# Altium footprint library S7CAS_LIB2023.PcbLib: 116 footprints (part 5 of 8)
Each footprint in its own frame and in the unit in brackets; x right, y up, seen from the top. Pads: shape width x height; smd on the part's side, far side on the other; paste and mask are expansions set on the pad; w line width, h text height; cw(c..) or ccw(c..) is an arc to the next point about the centre after c.
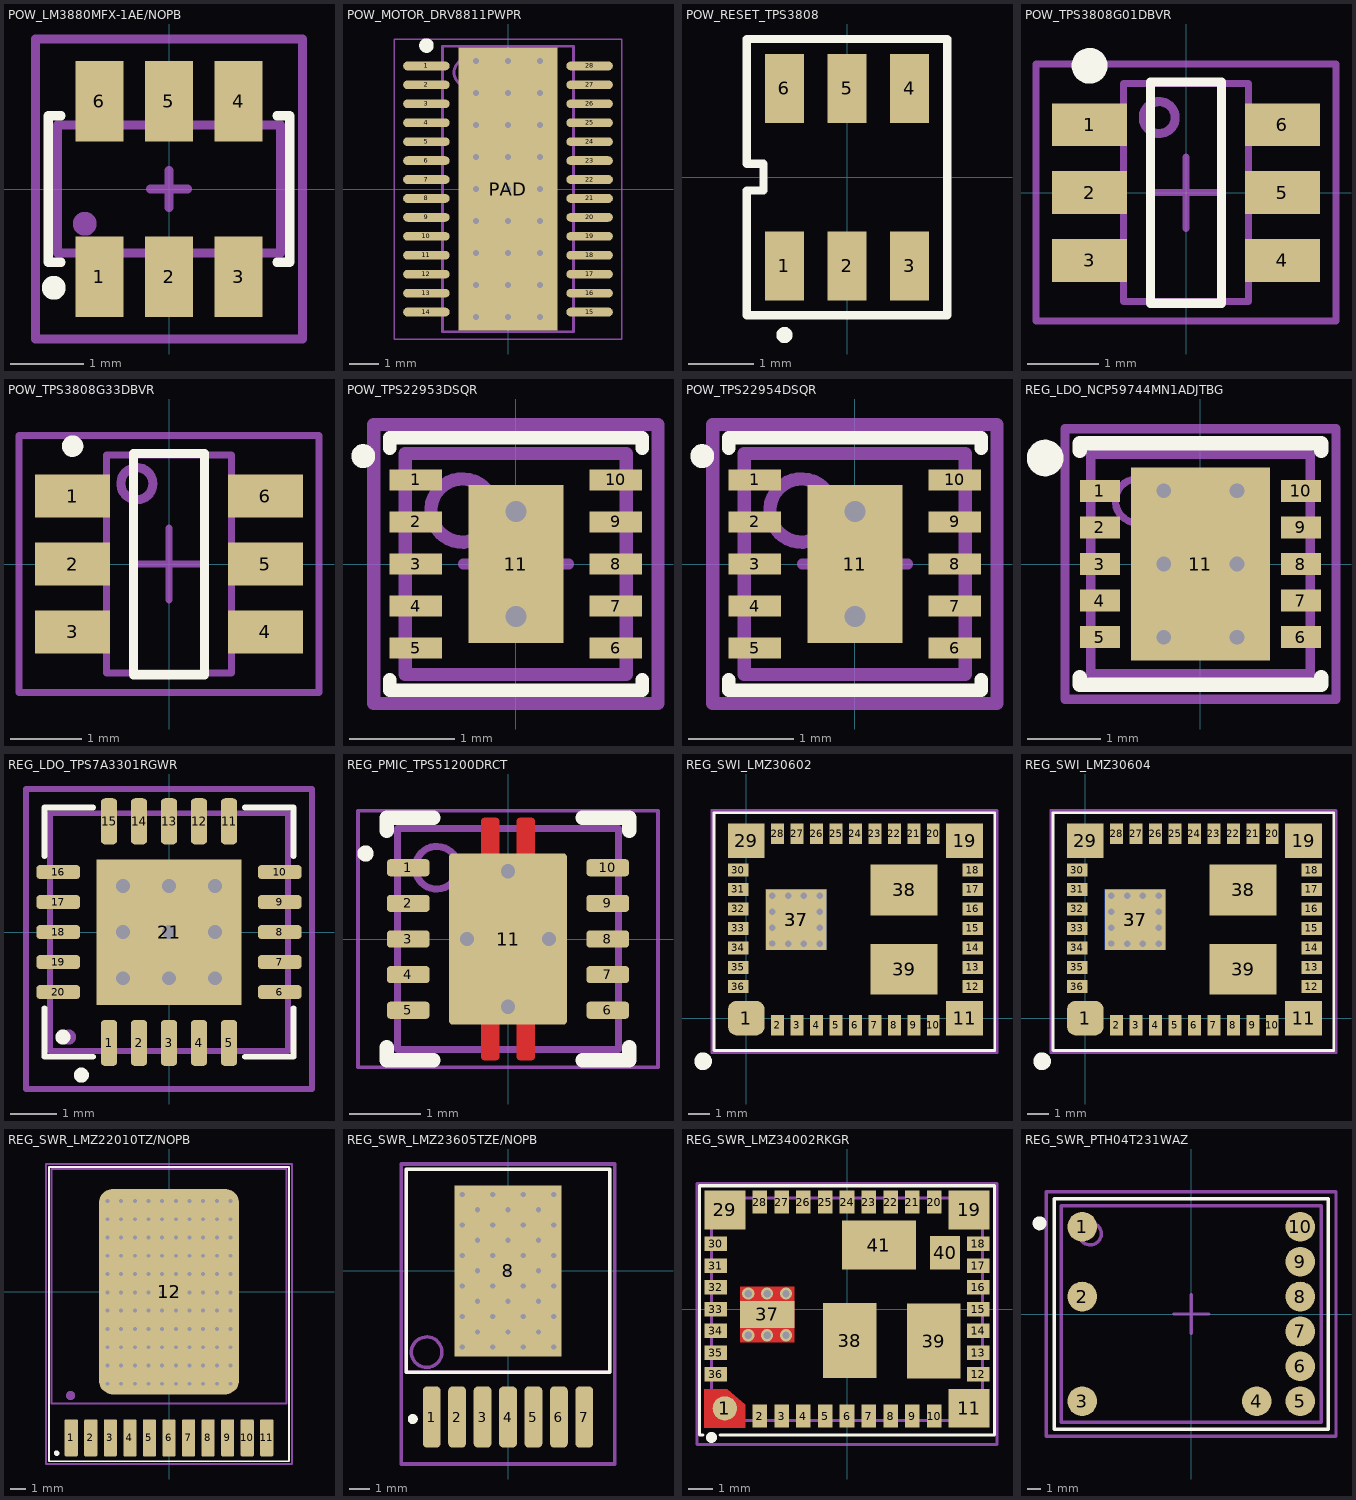
[diagram p4: the footprints below, top view; thin cyan lines are the x and y axes]

## POW_LM3880MFX-1AE/NOPB [mm]
pads (6):
  rect 0.65x1.1 smd paste-0.025 mask+0.07: 1(-0.95,-1.2) 2(0,-1.2) 3(0.95,-1.2) 4(0.95,1.2) 5(0,1.2) 6(-0.95,1.2)
Top Overlay:
  circle w0.254: c-1.575,-1.35 r0.035
  lines w0.127: -1.475,-1 -1.65,-1 -1.65,1 -1.475,1 ; 1.475,-1 1.65,-1 1.65,1 1.475,1
Top Assembly:
  circle w0.254: c-1.15,-0.475 r0.035
  lines w0.127: -1.525,-0.875 -1.525,0.875 1.525,0.875 1.525,-0.875 -1.525,-0.875
Mechanical 15:
  lines w0.127: -0.254,0 0.254,0 ; 0,-0.254 0,0.254 ; -1.825,-2.05 -1.825,2.05 1.825,2.05 1.825,-2.05 -1.825,-2.05
3D body "User Library-SOT-23-6.step": height 1.09, standoff 0, extent -1.394,-1.254 1.4,1.172

## POW_MOTOR_DRV8811PWPR [mm] "TSOP, 28-Leads, Body 9,70x4,40mm, Pitch 0,65mm, Thermal Pad 9,70x3,40mm, IPC Medium Density"
height 1.2
pads (29):
  oval 1.6x0.3 smd: 1(-2.8,4.225) 2(-2.8,3.575) 3(-2.8,2.925) 4(-2.8,2.275) 5(-2.8,1.625) 6(-2.8,0.975) 7(-2.8,0.325) 8(-2.8,-0.325) 9(-2.8,-0.975) 10(-2.8,-1.625) 11(-2.8,-2.275) 12(-2.8,-2.925) 13(-2.8,-3.575) 14(-2.8,-4.225) 15(2.8,-4.225) 16(2.8,-3.575) 17(2.8,-2.925) 18(2.8,-2.275) 19(2.8,-1.625) 20(2.8,-0.975) 21(2.8,-0.325) 22(2.8,0.325) 23(2.8,0.975) 24(2.8,1.625) 25(2.8,2.275) 26(2.8,2.925) 27(2.8,3.575) 28(2.8,4.225)
  rect 3.4x9.7 smd paste-15 mask-15: PAD(0,0)
via -1.1,4.4 diameter 0.5 hole 0.2
via 0,4.4 diameter 0.5 hole 0.2
via 1.1,4.4 diameter 0.5 hole 0.2
via -1.1,3.3 diameter 0.5 hole 0.2
via 0,3.3 diameter 0.5 hole 0.2
via 1.1,3.3 diameter 0.5 hole 0.2
via -1.1,2.2 diameter 0.5 hole 0.2
via 0,2.2 diameter 0.5 hole 0.2
via 1.1,2.2 diameter 0.5 hole 0.2
via -1.1,1.1 diameter 0.5 hole 0.2
via 0,1.1 diameter 0.5 hole 0.2
via 1.1,1.1 diameter 0.5 hole 0.2
via -1.1,0 diameter 0.5 hole 0.2
via 0,0 diameter 0.5 hole 0.2
via 1.1,0 diameter 0.5 hole 0.2
via -1.1,-1.1 diameter 0.5 hole 0.2
via 0,-1.1 diameter 0.5 hole 0.2
via 1.1,-1.1 diameter 0.5 hole 0.2
via -1.1,-2.2 diameter 0.5 hole 0.2
via 0,-2.2 diameter 0.5 hole 0.2
via 1.1,-2.2 diameter 0.5 hole 0.2
via -1.1,-3.3 diameter 0.5 hole 0.2
via 0,-3.3 diameter 0.5 hole 0.2
via 1.1,-3.3 diameter 0.5 hole 0.2
via -1.1,-4.4 diameter 0.5 hole 0.2
via 0,-4.4 diameter 0.5 hole 0.2
via 1.1,-4.4 diameter 0.5 hole 0.2
Top Overlay:
  circle w0.25: c-2.8,4.925 r0.125
Top Paste:
  rectangle: -1.55,-2.58 1.55,2.58
Top Solder:
  rectangle: -1.55,-2.58 1.55,2.58
Mechanical 13:
  circle w0.1: c-1.35,4 r0.5
  lines w0.1: -2.25,-4.9 -2.25,4.9 2.25,4.9 2.25,-4.9 -2.25,-4.9
Mechanical 15:
  lines w0.05: -3.9,-5.15 -3.9,5.15 3.9,5.15 3.9,-5.15 -3.9,-5.15
  lines w0.1: -0.5,0 0.5,0 ; 0,-0.5 0,0.5
3D body "PMIC_MOTOR_DRV8811PWPR.step": height 1.2, standoff 0, extent -3.2,-4.9 3.2,4.9

## POW_RESET_TPS3808 [mm]
pads (6):
  rect 0.6x1.05 smd paste-0.025 mask+0.07: 1(-0.95,-1.35) 2(0,-1.35) 3(0.95,-1.35) 4(0.95,1.35) 5(0,1.35) 6(-0.95,1.35)
Top Overlay:
  circle w0.127: c-0.95,-2.4 r0.06
  lines w0.127: -1.525,-2.1 1.525,-2.1 1.525,2.1 -1.525,2.1 -1.525,0.203 -1.269,0.203 -1.269,-0.203 -1.525,-0.203 -1.525,-2.1
3D body "SOT23-6.step": height 1.3, standoff 0, extent -1.5,-1.5 1.5,1.5

## POW_TPS3808G01DBVR [mm]
pads (6):
  rect 1.05x0.6 smd paste-0.025 mask+0.07: 1(-1.35,0.95) 2(-1.35,0) 3(-1.35,-0.95) 4(1.35,-0.95) 5(1.35,0) 6(1.35,0.95)
Top Overlay:
  circle w0.25: c-1.35,1.775 r0.125
  lines w0.127: -0.5,-1.55 0.5,-1.55 0.5,1.55 -0.5,1.55 -0.5,-1.55
Top Assembly:
  circle w0.127: c-0.375,1.05 r0.224
  lines w0.1: -0.875,-1.525 -0.875,1.525 0.875,1.525 0.875,-1.525 -0.875,-1.525
Mechanical 15:
  lines w0.1: -0.5,0 0.5,0 ; 0,-0.5 0,0.5 ; -2.1,-1.8 -2.1,1.8 2.1,1.8 2.1,-1.8 -2.1,-1.8
3D body "SOT23127P600-8N.step": height 1.45, standoff 0, extent -1.5,-1.525 1.5,1.525

## POW_TPS3808G33DBVR [mm]
pads (6):
  rect 1.05x0.6 smd paste-0.025 mask+0.07: 1(-1.35,0.95) 2(-1.35,0) 3(-1.35,-0.95) 4(1.35,-0.95) 5(1.35,0) 6(1.35,0.95)
Top Overlay:
  circle w0.15: c-1.35,1.65 r0.075
  lines w0.127: -0.5,-1.55 0.5,-1.55 0.5,1.55 -0.5,1.55 -0.5,-1.55
Top Assembly:
  circle w0.127: c-0.45,1.125 r0.225
  lines w0.1: -0.875,-1.525 -0.875,1.525 0.875,1.525 0.875,-1.525 -0.875,-1.525
Mechanical 15:
  lines w0.1: -0.5,0 0.5,0 ; 0,-0.5 0,0.5 ; -2.1,-1.8 -2.1,1.8 2.1,1.8 2.1,-1.8 -2.1,-1.8
3D body "SOT23127P600-8N.step": height 1.45, standoff 0, extent -1.5,-1.525 1.5,1.525

## POW_TPS22953DSQR [mm]
pads (11):
  rect 0.5x0.2 smd paste+0 mask+0.06: 1(-0.95,0.8) 2(-0.95,0.4) 3(-0.95,0) 4(-0.95,-0.4) 5(-0.95,-0.8) 6(0.95,-0.8) 7(0.95,-0.4) 8(0.95,0) 9(0.95,0.4) 10(0.95,0.8)
  rect 0.9x1.5 smd paste-5 mask+0.07: 11(0,0)
via 0,-0.5 diameter 0.4 hole 0.2
via 0,0.5 diameter 0.4 hole 0.2
Top Overlay:
  circle w0.127: c-1.45,1.025 r0.05
  lines w0.127: -1.2,-1.1 -1.2,-1.2 1.2,-1.2 1.2,-1.1 ; -1.2,1.1 -1.2,1.2 1.2,1.2 1.2,1.1
Top Paste:
  rectangle: -0.425,-0.69 0.425,0.69
Top Assembly:
  circle w0.127: c-0.508,0.508 r0.3
  lines w0.127: -1.05,-1.05 1.05,-1.05 1.05,1.05 -1.05,1.05 -1.05,-1.05
Mechanical 15:
  lines w0.1: -0.5,0 0.5,0 ; 0,-0.5 0,0.5
  lines w0.127: -1.35,-1.325 1.35,-1.325 1.35,1.325 -1.35,1.325 -1.35,-1.325
3D body "PSON40P200X80_HS-11N.step": height 0.8, standoff 0, extent -1.051,-1.05 1.051,1.05

## POW_TPS22954DSQR [mm]
pads (11):
  rect 0.5x0.2 smd paste+0 mask+0.06: 1(-0.95,0.8) 2(-0.95,0.4) 3(-0.95,0) 4(-0.95,-0.4) 5(-0.95,-0.8) 6(0.95,-0.8) 7(0.95,-0.4) 8(0.95,0) 9(0.95,0.4) 10(0.95,0.8)
  rect 0.9x1.5 smd paste-5 mask+0.07: 11(0,0)
via 0,0.5 diameter 0.4 hole 0.2
via 0,-0.5 diameter 0.4 hole 0.2
Top Overlay:
  circle w0.127: c-1.45,1.025 r0.05
  lines w0.127: -1.2,-1.1 -1.2,-1.2 1.2,-1.2 1.2,-1.1 ; -1.2,1.1 -1.2,1.2 1.2,1.2 1.2,1.1
Top Paste:
  rectangle: -0.425,-0.69 0.425,0.69
Top Assembly:
  circle w0.127: c-0.508,0.508 r0.3
  lines w0.127: -1.05,-1.05 -1.05,1.05 1.05,1.05 1.05,-1.05 -1.05,-1.05
Mechanical 15:
  lines w0.1: -0.5,0 0.5,0 ; 0,-0.5 0,0.5
  lines w0.127: -1.35,-1.325 -1.35,1.325 1.35,1.325 1.35,-1.325 -1.35,-1.325
3D body "PSON40P200X80_HS-11N.step": height 0.8, standoff 0, extent -1.051,-1.05 1.051,1.05

## REG_LDO_NCP59744MN1ADJTBG [mm]
pads (11):
  rect 0.55x0.3 smd paste-0.025 mask+0.04: 1(-1.375,1) 2(-1.375,0.5) 3(-1.375,0) 4(-1.375,-0.5) 5(-1.375,-1) 6(1.375,-1) 7(1.375,-0.5) 8(1.375,0) 9(1.375,0.5) 10(1.375,1)
  rect 1.9x2.64 smd paste-2.64 mask+0.03: 11(0,0)
via -0.5,0 diameter 0.4 hole 0.2
via 0.5,0 diameter 0.4 hole 0.2
via -0.5,1 diameter 0.4 hole 0.2
via -0.5,-1 diameter 0.4 hole 0.2
via 0.5,1 diameter 0.4 hole 0.2
via 0.5,-1 diameter 0.4 hole 0.2
Top Overlay:
  circle w0.25: c-2.125,1.45 r0.125
  lines w0.2: -1.65,-1.55 -1.65,-1.65 1.625,-1.65 ; -1.65,1.55 -1.65,1.65 ; -1.625,1.65 1.65,1.65 1.65,1.55 ; 1.65,-1.65 1.65,-1.55
Top Paste:
  rectangle: -0.9,-1.25 0.9,-0.1
  rectangle: -0.9,0.1 0.9,1.25
Top Assembly:
  circle w0.1: c-0.864,0.864 r0.3
  lines w0.1: -1.5,-1.5 1.5,-1.5 1.5,1.5 -1.5,1.5 -1.5,-1.5
  lines w0.127: -1.5,-1.5 -1.5,1.5 1.5,1.5 1.5,-1.5 -1.5,-1.5
Mechanical 15:
  lines w0.1: -0.5,0 0.5,0 ; 0,-0.5 0,0.5
  lines w0.127: -1.854,-1.85 -1.854,1.85 1.854,1.85 1.854,-1.85 -1.854,-1.85
3D body "QFN127P600-8N_2.step": height 1, standoff 0, extent -1.501,-1.5 1.501,1.5

## REG_LDO_TPS7A3301RGWR [mm]
pads (21):
  rrect50% 0.35x1 smd paste-0.025 mask+0.07: 1(-1.3,-2.4) 2(-0.65,-2.4) 3(0,-2.4) 4(0.65,-2.4) 5(1.3,-2.4) 11(1.3,2.4) 12(0.65,2.4) 13(0,2.4) 14(-0.65,2.4) 15(-1.3,2.4)
  rrect50% 0.95x0.3 smd paste-0.025 mask+0.07: 6(2.4,-1.3) 7(2.4,-0.65) 8(2.4,0) 9(2.4,0.65) 10(2.4,1.3) 16(-2.4,1.3) 17(-2.4,0.65) 18(-2.4,0) 19(-2.4,-0.65) 20(-2.4,-1.3)
  rect 3.15x3.15 smd paste-3.15 mask+0: 21(0,0)
via 1,-1 diameter 0.5 hole 0.3
via 0,-1 diameter 0.5 hole 0.3
via 0,1 diameter 0.5 hole 0.3
via -1,1 diameter 0.5 hole 0.3
via -1,-1 diameter 0.5 hole 0.3
via -1,0 diameter 0.5 hole 0.3
via 0,0 diameter 0.5 hole 0.3
via 1,1 diameter 0.5 hole 0.3
via 1,0 diameter 0.5 hole 0.3
Top Overlay:
  circle w0.254: c-2.3,-2.275 r0.035
  circle w0.254: c-1.9,-3.1 r0.035
  lines w0.127: -2.7,-1.65 -2.7,-2.7 -1.65,-2.7 ; -2.7,1.65 -2.7,2.7 -1.65,2.7 ; 1.65,-2.7 2.7,-2.7 2.7,-1.65 ; 1.65,2.7 2.7,2.7 2.7,1.65
Top Paste:
  rectangle: -1.5,0.2 -0.2,1.5
  rectangle: -1.5,-1.5 -0.2,-0.2
  rectangle: 0.2,-1.5 1.5,-0.2
  rectangle: 0.2,0.2 1.5,1.5
  region: -0.55,-1.05
Top Assembly:
  circle w0.254: c-2.175,-2.275 r0.035
  lines w0.127: -2.575,-2.575 2.575,-2.575 2.575,2.575 -2.575,2.575 -2.575,-2.575
Mechanical 15:
  lines w0.127: -0.5,0 0.5,0 ; 0,-0.5 0,0.5 ; -3.1,-3.4 -3.1,3.1 3.1,3.1 3.1,-3.4 -3.1,-3.4
3D body "User Library-QFN-20 5x5x0_9mm.step": height 0.88, standoff -0.02, extent -2.51,-2.51 2.51,2.51

## REG_PMIC_TPS51200DRCT [mm]
pads (11):
  rrect41% 0.6x0.24 smd mask+0.07: 1(-1.4,1) 2(-1.4,0.5) 3(-1.4,0) 4(-1.4,-0.5) 5(-1.4,-1) 6(1.4,-1) 7(1.4,-0.5) 8(1.4,0) 9(1.4,0.5) 10(1.4,1)
  rrect5% 1.65x2.4 smd paste-5 mask+0.07: 11(0,0)
via 0,-0.95 diameter 0.5 hole 0.2
via 0.575,0 diameter 0.5 hole 0.2
via -0.575,0 diameter 0.5 hole 0.2
via 0,0.95 diameter 0.5 hole 0.2
Top Layer:
  region: -0.325,-1.7 -0.335,-1.7 -0.353,-1.692 -0.367,-1.678 -0.375,-1.66 -0.375,-1.65 -0.375,1.65 -0.375,1.66 -0.367,1.678 -0.353,1.692 -0.335,1.7 -0.325,1.7 -0.175,1.7 -0.165,1.7 -0.147,1.692 -0.133,1.678 -0.125,1.66 -0.125,1.65 -0.125,-1.65 -0.125,-1.66 -0.133,-1.678 -0.147,-1.692 -0.165,-1.7 -0.175,-1.7
  region: 0.175,-1.7 0.165,-1.7 0.147,-1.692 0.133,-1.678 0.125,-1.66 0.125,-1.65 0.125,1.65 0.125,1.66 0.133,1.678 0.147,1.692 0.165,1.7 0.175,1.7 0.325,1.7 0.335,1.7 0.353,1.692 0.367,1.678 0.375,1.66 0.375,1.65 0.375,-1.65 0.375,-1.66 0.367,-1.678 0.353,-1.692 0.335,-1.7 0.325,-1.7
Top Overlay:
  circle w0.127: c-2,1.2 r0.05
  lines w0.2: -1.7,-1.52 -1.7,-1.7 -1.045,-1.7 ; -1.7,1.52 -1.7,1.7 -1.045,1.7 ; 1.045,-1.7 1.7,-1.7 1.7,-1.52 ; 1.045,1.7 1.7,1.7 1.7,1.52
Top Paste:
  drawing of 7 lines, arcs and shapes, not listed
Top Assembly:
  circle w0.1: c-1,1 r0.3
  lines w0.1: -1.55,-1.55 -1.55,1.55 1.55,1.55 1.55,-1.55 -1.55,-1.55
Mechanical 15:
  lines w0.05: -2.105,-1.8 -2.105,1.8 2.105,1.8 2.105,-1.8 -2.105,-1.8
  lines w0.1: -0.5,0 0.5,0 ; 0,-0.5 0,0.5
3D body "REG_PMIC_TPS51200DRCT.step": height 1, standoff 0, extent -1.551,-1.55 1.551,1.55

## REG_SWI_LMZ30602 [mm] "Non-Isolated PoL Module DC DC Converter 1 Output 0.8 ~ 3.6V 2A 2.95V - 6V Input"
pads (40):
  rrect50% 1.7x1.6 smd mask+0.07: 1(0,0)
  rect 0.6x0.95 smd mask+0.07: 2(1.45,-0.325) 3(2.35,-0.325) 4(3.25,-0.325) 5(4.15,-0.325) 6(5.05,-0.325) 7(5.95,-0.325) 8(6.85,-0.325) 9(7.75,-0.325) 10(8.65,-0.325) 20(8.65,8.525) 21(7.75,8.525) 22(6.85,8.525) 23(5.95,8.525) 24(5.05,8.525) 25(4.15,8.525) 26(3.25,8.525) 27(2.35,8.525) 28(1.45,8.525)
  rect 1.7x1.6 smd mask+0.07: 11(10.1,0) 19(10.1,8.2) 29(0,8.2)
  rect 0.95x0.6 smd mask+0.07: 12(10.475,1.45) 13(10.475,2.35) 14(10.475,3.25) 15(10.475,4.15) 16(10.475,5.05) 17(10.475,5.95) 18(10.475,6.85) 30(-0.375,6.85) 31(-0.375,5.95) 32(-0.375,5.05) 33(-0.375,4.15) 34(-0.375,3.25) 35(-0.375,2.35) 36(-0.375,1.45)
  rect 2.8x2.8 smd mask+0.07: 37(2.3,4.55)
  rect 2.8x2.8 smd far side mask+0.07: 37(2.3,4.55)
  rect 3.1x2.35 smd mask+0.07: 38(7.3,5.93) 39(7.3,2.26)
via 2.667,5.65 diameter 0.5 hole 0.3
via 1.937,5.65 diameter 0.5 hole 0.3
via 1.2,5.65 diameter 0.5 hole 0.3
via 1.2,4.915 diameter 0.5 hole 0.3
via 1.2,3.45 diameter 0.5 hole 0.3
via 1.2,4.185 diameter 0.5 hole 0.3
via 3.402,3.45 diameter 0.5 hole 0.3
via 2.667,3.45 diameter 0.5 hole 0.3
via 1.937,3.45 diameter 0.5 hole 0.3
via 3.402,5.65 diameter 0.5 hole 0.3
via 3.402,4.915 diameter 0.5 hole 0.3
via 3.402,4.185 diameter 0.5 hole 0.3
Top Overlay:
  circle w0.254: c-2,-2 r0.02
  circle w0.254: c-2,-2 r0.145
  circle w0.254: c-2,-2 r0.283
  lines w0.127: -1.5,-1.5 -1.5,9.5 11.5,9.5 11.5,-1.5 -1.5,-1.5
  text ".Designator" at 0.754,10.008 h0.76
Top Designator:
  text ".Designator" at 1.454,3.958 h0.76
Mechanical 15:
  lines w0.127: -1.6,-1.6 -1.6,9.6 11.6,9.6 11.6,-1.6 -1.6,-1.6
3D body "RKG0039A.stp": height 2.9, standoff 0, extent -0.4,-0.4 10.6,8.6

## REG_SWI_LMZ30604 [mm] "Non-Isolated PoL Module DC DC Converter 1 Output 0.8 ~ 3.6V 4A 2.95V - 6V Input"
pads (40):
  rrect50% 1.7x1.6 smd mask+0.07: 1(0,0)
  rect 0.6x0.95 smd mask+0.07: 2(1.45,-0.325) 3(2.35,-0.325) 4(3.25,-0.325) 5(4.15,-0.325) 6(5.05,-0.325) 7(5.95,-0.325) 8(6.85,-0.325) 9(7.75,-0.325) 10(8.65,-0.325) 20(8.65,8.525) 21(7.75,8.525) 22(6.85,8.525) 23(5.95,8.525) 24(5.05,8.525) 25(4.15,8.525) 26(3.25,8.525) 27(2.35,8.525) 28(1.45,8.525)
  rect 1.7x1.6 smd mask+0.07: 11(10.1,0) 19(10.1,8.2) 29(0,8.2)
  rect 0.95x0.6 smd mask+0.07: 12(10.475,1.45) 13(10.475,2.35) 14(10.475,3.25) 15(10.475,4.15) 16(10.475,5.05) 17(10.475,5.95) 18(10.475,6.85) 30(-0.375,6.85) 31(-0.375,5.95) 32(-0.375,5.05) 33(-0.375,4.15) 34(-0.375,3.25) 35(-0.375,2.35) 36(-0.375,1.45)
  rect 2.8x2.8 smd mask+0.07: 37(2.3,4.55)
  rect 2.8x2.8 smd far side mask+0.07: 37(2.3,4.55)
  rect 3.1x2.35 smd mask+0.07: 38(7.3,5.93) 39(7.3,2.26)
via 2.667,5.65 diameter 0.5 hole 0.3
via 1.937,5.65 diameter 0.5 hole 0.3
via 1.2,5.65 diameter 0.5 hole 0.3
via 1.2,4.915 diameter 0.5 hole 0.3
via 1.2,3.45 diameter 0.5 hole 0.3
via 1.2,4.185 diameter 0.5 hole 0.3
via 3.402,3.45 diameter 0.5 hole 0.3
via 2.667,3.45 diameter 0.5 hole 0.3
via 1.937,3.45 diameter 0.5 hole 0.3
via 3.402,5.65 diameter 0.5 hole 0.3
via 3.402,4.915 diameter 0.5 hole 0.3
via 3.402,4.185 diameter 0.5 hole 0.3
Top Overlay:
  circle w0.254: c-2,-2 r0.02
  circle w0.254: c-2,-2 r0.145
  circle w0.254: c-2,-2 r0.283
  lines w0.127: -1.5,-1.5 11.5,-1.5 11.5,9.5 -1.5,9.5 -1.5,-1.5
  text ".Designator" at 0.754,10.008 h0.76
Top Designator:
  text ".Designator" at 1.454,3.958 h0.76
Mechanical 15:
  lines w0.127: -1.6,-1.6 11.6,-1.6 11.6,9.6 -1.6,9.6 -1.6,-1.6
3D body "RKG0039A.stp": height 2.9, standoff 0, extent -0.4,-0.4 10.6,8.6

## REG_SWR_LMZ22010TZ/NOPB [mm]
pads (12):
  rrect20% 0.86x2.41 smd paste-0.025 mask+0.07: 1(-6.35,-9.5) 2(-5.08,-9.5) 3(-3.81,-9.5) 4(-2.54,-9.5) 5(-1.27,-9.5) 6(0,-9.5) 7(1.27,-9.5) 8(2.54,-9.5) 9(3.81,-9.5) 10(5.08,-9.5) 11(6.35,-9.5)
  rrect20% 9.126x13.37 smd paste-13.37 mask+0.05: 12(0,0)
via 4,-5.987 diameter 0.457 hole 0.254
via 3.111,-5.987 diameter 0.457 hole 0.254
via 2.222,-5.987 diameter 0.457 hole 0.254
via 1.333,-5.987 diameter 0.457 hole 0.254
via 0.445,-5.987 diameter 0.457 hole 0.254
via -0.445,-5.987 diameter 0.457 hole 0.254
via -1.333,-5.987 diameter 0.457 hole 0.254
via -2.222,-5.987 diameter 0.457 hole 0.254
via -3.111,-5.987 diameter 0.457 hole 0.254
via -4,-5.987 diameter 0.457 hole 0.254
via 4,-4.798 diameter 0.457 hole 0.254
via 3.111,-4.798 diameter 0.457 hole 0.254
via 2.222,-4.798 diameter 0.457 hole 0.254
via 1.333,-4.798 diameter 0.457 hole 0.254
via 0.445,-4.798 diameter 0.457 hole 0.254
via -0.445,-4.798 diameter 0.457 hole 0.254
via -1.333,-4.798 diameter 0.457 hole 0.254
via -2.222,-4.798 diameter 0.457 hole 0.254
via -3.111,-4.798 diameter 0.457 hole 0.254
via -4,-4.798 diameter 0.457 hole 0.254
via 4,-3.61 diameter 0.457 hole 0.254
via 3.111,-3.61 diameter 0.457 hole 0.254
via 2.222,-3.61 diameter 0.457 hole 0.254
via 1.333,-3.61 diameter 0.457 hole 0.254
via 0.445,-3.61 diameter 0.457 hole 0.254
via -0.445,-3.61 diameter 0.457 hole 0.254
via -1.333,-3.61 diameter 0.457 hole 0.254
via -2.222,-3.61 diameter 0.457 hole 0.254
via -3.111,-3.61 diameter 0.457 hole 0.254
via -4,-3.61 diameter 0.457 hole 0.254
via 4,-2.421 diameter 0.457 hole 0.254
via 3.111,-2.421 diameter 0.457 hole 0.254
via 2.222,-2.421 diameter 0.457 hole 0.254
via 1.333,-2.421 diameter 0.457 hole 0.254
via 0.445,-2.421 diameter 0.457 hole 0.254
via -0.445,-2.421 diameter 0.457 hole 0.254
via -1.333,-2.421 diameter 0.457 hole 0.254
via -2.222,-2.421 diameter 0.457 hole 0.254
via -3.111,-2.421 diameter 0.457 hole 0.254
via -4,-2.421 diameter 0.457 hole 0.254
via 4,-1.232 diameter 0.457 hole 0.254
via 3.111,-1.232 diameter 0.457 hole 0.254
via 2.222,-1.232 diameter 0.457 hole 0.254
via 1.333,-1.232 diameter 0.457 hole 0.254
via 0.445,-1.232 diameter 0.457 hole 0.254
via -0.445,-1.232 diameter 0.457 hole 0.254
via -1.333,-1.232 diameter 0.457 hole 0.254
via -2.222,-1.232 diameter 0.457 hole 0.254
via -3.111,-1.232 diameter 0.457 hole 0.254
via -4,-1.232 diameter 0.457 hole 0.254
via 4,-0.044 diameter 0.457 hole 0.254
via 3.111,-0.044 diameter 0.457 hole 0.254
via 2.222,-0.044 diameter 0.457 hole 0.254
via 1.333,-0.044 diameter 0.457 hole 0.254
via 0.445,-0.044 diameter 0.457 hole 0.254
via -0.445,-0.044 diameter 0.457 hole 0.254
via -1.333,-0.044 diameter 0.457 hole 0.254
via -2.222,-0.044 diameter 0.457 hole 0.254
via -3.111,-0.044 diameter 0.457 hole 0.254
via -4,-0.044 diameter 0.457 hole 0.254
via 4,1.145 diameter 0.457 hole 0.254
via 3.111,1.145 diameter 0.457 hole 0.254
via 2.222,1.145 diameter 0.457 hole 0.254
via 1.333,1.145 diameter 0.457 hole 0.254
via 0.445,1.145 diameter 0.457 hole 0.254
via -0.445,1.145 diameter 0.457 hole 0.254
via -1.333,1.145 diameter 0.457 hole 0.254
via -2.222,1.145 diameter 0.457 hole 0.254
via -3.111,1.145 diameter 0.457 hole 0.254
via -4,1.145 diameter 0.457 hole 0.254
via 4,2.334 diameter 0.457 hole 0.254
via 3.111,2.334 diameter 0.457 hole 0.254
via 2.222,2.334 diameter 0.457 hole 0.254
via 1.333,2.334 diameter 0.457 hole 0.254
via 0.445,2.334 diameter 0.457 hole 0.254
via -0.445,2.334 diameter 0.457 hole 0.254
via -1.333,2.334 diameter 0.457 hole 0.254
via -2.222,2.334 diameter 0.457 hole 0.254
via -3.111,2.334 diameter 0.457 hole 0.254
via -4,2.334 diameter 0.457 hole 0.254
via 4,3.523 diameter 0.457 hole 0.254
via 3.111,3.523 diameter 0.457 hole 0.254
via 2.222,3.523 diameter 0.457 hole 0.254
via 1.333,3.523 diameter 0.457 hole 0.254
via 0.445,3.523 diameter 0.457 hole 0.254
via -0.445,3.523 diameter 0.457 hole 0.254
via -1.333,3.523 diameter 0.457 hole 0.254
via -2.222,3.523 diameter 0.457 hole 0.254
via -3.111,3.523 diameter 0.457 hole 0.254
via -4,3.523 diameter 0.457 hole 0.254
via 4,4.711 diameter 0.457 hole 0.254
via 3.111,4.711 diameter 0.457 hole 0.254
via 2.222,4.711 diameter 0.457 hole 0.254
via 1.333,4.711 diameter 0.457 hole 0.254
via 0.445,4.711 diameter 0.457 hole 0.254
via -0.445,4.711 diameter 0.457 hole 0.254
via -1.333,4.711 diameter 0.457 hole 0.254
via -2.222,4.711 diameter 0.457 hole 0.254
via -3.111,4.711 diameter 0.457 hole 0.254
via -4,4.711 diameter 0.457 hole 0.254
via 4,5.9 diameter 0.457 hole 0.254
via 3.111,5.9 diameter 0.457 hole 0.254
via 2.222,5.9 diameter 0.457 hole 0.254
via 1.333,5.9 diameter 0.457 hole 0.254
via 0.445,5.9 diameter 0.457 hole 0.254
via -0.445,5.9 diameter 0.457 hole 0.254
via -1.333,5.9 diameter 0.457 hole 0.254
via -2.222,5.9 diameter 0.457 hole 0.254
via -3.111,5.9 diameter 0.457 hole 0.254
via -4,5.9 diameter 0.457 hole 0.254
Top Overlay:
  circle w0.254: c-7.3,-10.5 r0.051
  lines w0.127: -7.8,-11.024 -7.8,8.1 7.8,8.1 7.8,-11.024 -7.8,-11.024
Top Paste:
  rectangle: -0.7,2.7 0.7,4.1
  rectangle: -2.4,2.7 -1,4.1
  rectangle: 1,2.7 2.4,4.1
  rectangle: 2.7,2.7 4.1,4.1
  rectangle: -4.1,2.7 -2.7,4.1
  rectangle: -4.1,1 -2.7,2.4
  rectangle: 2.7,1 4.1,2.4
  rectangle: 1,1 2.4,2.4
  rectangle: -2.4,1 -1,2.4
  rectangle: -0.7,1 0.7,2.4
  rectangle: -4.1,-0.7 -2.7,0.7
  rectangle: 2.7,-0.7 4.1,0.7
  rectangle: 1,-0.7 2.4,0.7
  rectangle: -2.4,-0.7 -1,0.7
  rectangle: -0.7,-0.7 0.7,0.7
  region: 0.7,5.8 -0.7,5.8 -0.7,4.4 0.7,4.4
  rectangle: -4.1,4.4 -2.7,5.8
  rectangle: 2.7,4.4 4.1,5.8
  rectangle: 1,4.4 2.4,5.8
  rectangle: -2.4,4.4 -1,5.8
  region: 2.4,-4.4 1,-4.4 1,-5.8 2.4,-5.8
  region: -1,-4.4 -2.4,-4.4 -2.4,-5.8 -1,-5.8
  region: -2.7,-4.4 -4.1,-4.4 -4.1,-5.8 -2.7,-5.8
  region: 4.1,-4.4 2.7,-4.4 2.7,-5.8 4.1,-5.8
  rectangle: -0.7,-5.8 0.7,-4.4
  region: 0.7,-1 -0.7,-1 -0.7,-2.4 0.7,-2.4
  region: 2.4,-1 1,-1 1,-2.4 2.4,-2.4
  region: -1,-1 -2.4,-1 -2.4,-2.4 -1,-2.4
  region: -2.7,-1 -4.1,-1 -4.1,-2.4 -2.7,-2.4
  region: 4.1,-1 2.7,-1 2.7,-2.4 4.1,-2.4
  region: 4.1,-2.7 2.7,-2.7 2.7,-4.1 4.1,-4.1
  region: -2.7,-2.7 -4.1,-2.7 -4.1,-4.1 -2.7,-4.1
  region: -1,-2.7 -2.4,-2.7 -2.4,-4.1 -1,-4.1
  region: 2.4,-2.7 1,-2.7 1,-4.1 2.4,-4.1
  region: 0.7,-2.7 -0.7,-2.7 -0.7,-4.1 0.7,-4.1
Top Assembly:
  circle w0.3: c-6.4,-6.75 r0.15
  lines w0.127: -7.625,-7.275 -7.625,7.975 7.625,7.975 7.625,-7.275 -7.625,-7.275
Mechanical 15:
  lines w0.127: -8,-11.201 -8,8.3 8,8.3 8,-11.201 -8,-11.201
3D body "User Library-NATIONALSEMI-TZA11A.step": height 6, standoff 0, extent -7.625,-10.515 7.625,8.015

## REG_SWR_LMZ23605TZE/NOPB [mm]
pads (8):
  rrect50% 0.89x3.06 smd paste+0 mask+0.07: 1(-3.81,-7.305) 2(-2.54,-7.305) 3(-1.27,-7.305) 4(0,-7.305) 5(1.27,-7.305) 6(2.54,-7.305) 7(3.81,-7.305)
  rect 5.35x8.54 smd paste-10 mask+0.07: 8(0,0)
via 0,0 diameter 0.508 hole 0.254
via 0,1.524 diameter 0.508 hole 0.254
via 0,3.048 diameter 0.508 hole 0.254
via -1.524,-3.048 diameter 0.508 hole 0.254
via -2.286,-2.286 diameter 0.508 hole 0.254
via -2.286,-3.81 diameter 0.508 hole 0.254
via -0.762,-3.81 diameter 0.508 hole 0.254
via 0.762,-3.81 diameter 0.508 hole 0.254
via 2.286,-3.81 diameter 0.508 hole 0.254
via 0,-3.048 diameter 0.508 hole 0.254
via 1.524,-3.048 diameter 0.508 hole 0.254
via -0.762,-2.286 diameter 0.508 hole 0.254
via 0.762,-2.286 diameter 0.508 hole 0.254
via 2.286,-2.286 diameter 0.508 hole 0.254
via -1.524,-1.524 diameter 0.508 hole 0.254
via 0,-1.524 diameter 0.508 hole 0.254
via 1.524,-1.524 diameter 0.508 hole 0.254
via -2.286,-0.762 diameter 0.508 hole 0.254
via -0.762,-0.762 diameter 0.508 hole 0.254
via 0.762,-0.762 diameter 0.508 hole 0.254
via 2.286,-0.762 diameter 0.508 hole 0.254
via -1.524,0 diameter 0.508 hole 0.254
via 1.524,0 diameter 0.508 hole 0.254
via -2.286,0.762 diameter 0.508 hole 0.254
via -0.762,0.762 diameter 0.508 hole 0.254
via 0.762,0.762 diameter 0.508 hole 0.254
via 2.286,0.762 diameter 0.508 hole 0.254
via -1.524,1.524 diameter 0.508 hole 0.254
via 1.524,1.524 diameter 0.508 hole 0.254
via -2.286,2.286 diameter 0.508 hole 0.254
via -0.762,2.286 diameter 0.508 hole 0.254
via 0.762,2.286 diameter 0.508 hole 0.254
via 2.286,2.286 diameter 0.508 hole 0.254
via -1.524,3.048 diameter 0.508 hole 0.254
via 1.524,3.048 diameter 0.508 hole 0.254
via 2.286,3.81 diameter 0.508 hole 0.254
via 0.762,3.81 diameter 0.508 hole 0.254
via -0.762,3.81 diameter 0.508 hole 0.254
via -2.286,3.81 diameter 0.508 hole 0.254
Top Overlay:
  circle w0.25: c-4.757,-7.405 r0.125
  lines w0.175: -5.08,-5.08 -5.08,5.08 5.08,5.08 5.08,-5.08 -5.08,-5.08
Top Paste:
  rectangle: -2.675,-1.355 -0.1,1.355
  rectangle: -2.675,-4.265 -0.1,-1.555
  rectangle: -2.675,1.555 -0.1,4.265
  region: 2.675,4.265 0.1,4.265 0.1,1.555 2.675,1.555
  region: 2.675,-1.555 0.1,-1.555 0.1,-4.265 2.675,-4.265
  region: 2.675,1.355 0.1,1.355 0.1,-1.355 2.675,-1.355
Top Assembly:
  circle w0.175: c-4.064,-4.064 r0.762
  lines w0.175: -5.08,-5.08 -5.08,5.08 5.08,5.08 5.08,-5.08 -5.08,-5.08
Mechanical 15:
  lines w0.175: -0.762,0 0,0 ; 0,-0.762 0,0 ; 0,0.762 0,0 ; 0.762,0 0,0 ; -5.334,-9.652 5.334,-9.652 5.334,5.334 -5.334,5.334 -5.334,-9.652
3D body "LMZ-PMOD-7.step": height 4.57, standoff 0, extent -5.105,-8.825 5.055,4.951

## REG_SWR_LMZ34002RKGR [mm]
pads (41):
  round 1 smd paste-1.7 mask-1.7: 1(-5.05,-4.1)
  rect 0.6x0.95 smd paste-0.025 mask+0.07: 2(-3.6,-4.425) 3(-2.7,-4.425) 4(-1.8,-4.425) 5(-0.9,-4.425) 6(0,-4.425) 7(0.9,-4.425) 8(1.8,-4.425) 9(2.7,-4.425) 10(3.6,-4.425) 20(3.6,4.425) 21(2.7,4.425) 22(1.8,4.425) 23(0.9,4.425) 24(0,4.425) 25(-0.9,4.425) 26(-1.8,4.425) 27(-2.7,4.425) 28(-3.6,4.425)
  rect 1.7x1.6 smd paste-2 mask+0.07: 11(5.05,-4.1) 19(5.05,4.1) 29(-5.05,4.1)
  rect 0.95x0.6 smd paste-0.025 mask+0.07: 12(5.425,-2.7) 13(5.425,-1.8) 14(5.425,-0.9) 15(5.425,0) 16(5.425,0.9) 17(5.425,1.8) 18(5.425,2.7) 30(-5.425,2.7) 31(-5.425,1.8) 32(-5.425,0.9) 33(-5.425,0) 34(-5.425,-0.9) 35(-5.425,-1.8) 36(-5.425,-2.7)
  rect 2.25x1.1 smd paste-2 mask+0.07: 37(-3.3,-0.22)
  rect 2.2x3.1 smd paste-3.1 mask+0.07: 38(0.11,-1.3)
  rect 2.2x3.1 smd paste-3.1 mask+0.05: 39(3.59,-1.32)
  rect 1.24x1.4 smd paste-2 mask+0.05: 40(4.06,2.33)
  rect 3.05x2.04 smd paste-3.05 mask+0.05: 41(1.32,2.65)
via -4.08,0.64 diameter 0.5 hole 0.3
via -3.3,0.64 diameter 0.5 hole 0.3
via -2.52,0.64 diameter 0.5 hole 0.3
via -2.52,-1.08 diameter 0.5 hole 0.3
via -3.3,-1.08 diameter 0.5 hole 0.3
via -4.08,-1.08 diameter 0.5 hole 0.3
Top Layer:
  rectangle: -4.425,-1.37 -2.175,0.93
  region: -5.9,-4.9 -5.9,-3.3 -4.95,-3.3 -4.2,-3.95 -4.2,-4.9
  region: -4.43,1.04
Top Overlay:
  circle w0.254: c-5.6,-5.3 r0.1
  lines w0.127: -5.95,-5.2 -6.1,-5.2 -6.1,5.1 6.1,5.1 6.1,-5.2 -5.25,-5.2
Top Paste:
  rectangle: 4.315,-4.72 5.785,-3.48
  rectangle: 4.315,3.48 5.785,4.72
  rectangle: -5.785,3.48 -4.315,4.72
  rectangle: -0.84,-1.15 -0.04,0.13
  rectangle: 0.26,-1.15 1.06,0.13
  rectangle: -0.84,-2.73 -0.04,-1.45
  rectangle: 0.26,-2.73 1.06,-1.45
  rectangle: 3.74,-2.73 4.54,-1.45
  rectangle: 2.64,-2.73 3.44,-1.45
  rectangle: 3.74,-1.15 4.54,0.13
  rectangle: 2.64,-1.15 3.44,0.13
  rectangle: -0.11,1.77 1.17,2.5
  rectangle: -0.11,2.8 1.17,3.53
  rectangle: 1.47,1.77 2.75,2.5
  rectangle: 1.47,2.8 2.75,3.53
  rectangle: -3.15,-0.645 -2.3,0.205
  rectangle: -4.3,-0.645 -3.45,0.205
  rectangle: 3.54,1.68 4.58,2.18
  rectangle: 3.54,2.48 4.58,2.98
  region: -5.78,-4.72 -4.31,-4.72 -4.31,-4 -4.9,-3.48 -5,-3.48 -5.78,-3.48
Top Assembly:
  circle w0.254: c-5.03,-4.07 r0.1
  lines w0.127: -5.6,-4.6 -5.6,4.6 5.6,4.6 5.6,-4.6 -5.6,-4.6
Mechanical 13:
  text "The 3D model is a 39pin instead of 41. For package representation only" at -3.8,-3.625 h0.1
Mechanical 15:
  lines w0.127: -0.2,0 0.2,0 ; 0,-0.2 0,0.2 ; -6.2,-5.6 -6.2,5.2 6.2,5.2 6.2,-5.6 -6.2,-5.6
3D body "B1QFN-39.STEP": height 2.95, standoff 0, extent -5.55,-4.55 5.55,4.55

## REG_SWR_PTH04T231WAZ [mil]
pads (10):
  round 85 smd paste+0 mask+2.76: 1(-312.5,250) 2(-312.5,50) 3(-312.5,-250) 4(187.5,-250) 5(312.5,-250) 6(312.5,-150) 7(312.5,-50) 8(312.5,50) 9(312.5,150) 10(312.5,250)
Top Overlay:
  circle w20: c-435,260 r10
  lines w10: -392.5,-330 -392.5,330 392.5,330 392.5,-330 -392.5,-330
Top Assembly:
  circle w10: c-290,230 r32.02
  lines w10: -372.5,-310 372.5,-310 372.5,310 -372.5,310 -372.5,-310
Mechanical 15:
  lines w10: -50,0 50,0 ; 0,-55 0,55 ; -415,-350 -415,350 415,350 415,225 415,-235 415,-350 -415,-350
3D body: height 10, standoff 0, extent -455,330 -455,330
3D body: height 100, standoff 40, extent -369.5,-310 375.5,310
3D body: height 325, standoff 100, extent 25,-160 225,30
3D body: height 40, standoff 0, extent 292.67,230.09 332.33,269.91
3D body: height 40, standoff 0, extent 292.67,130.09 332.33,169.91
3D body: height 40, standoff 0, extent 292.67,30.09 332.33,69.91
3D body: height 40, standoff 0, extent 292.67,-69.91 332.33,-30.09
3D body: height 40, standoff 0, extent 292.67,-169.91 332.33,-130.09
3D body: height 40, standoff 0, extent 292.67,-269.91 332.33,-230.09
3D body: height 40, standoff 0, extent 167.67,-269.91 207.33,-230.09
3D body: height 40, standoff 0, extent -332.33,-269.91 -292.67,-230.09
3D body: height 40, standoff 0, extent -332.33,30.09 -292.67,69.92
3D body: height 40, standoff 0, extent -332.33,230.09 -292.67,269.91